# Altium footprint library PcbLib_jp.PcbLib: 178 footprints (part 6 of 12)
Each footprint in its own frame and in the unit in brackets; x right, y up, seen from the top. Pads: shape width x height; smd on the part's side, far side on the other; paste and mask are expansions set on the pad; w line width, h text height; cw(c..) or ccw(c..) is an arc to the next point about the centre after c.
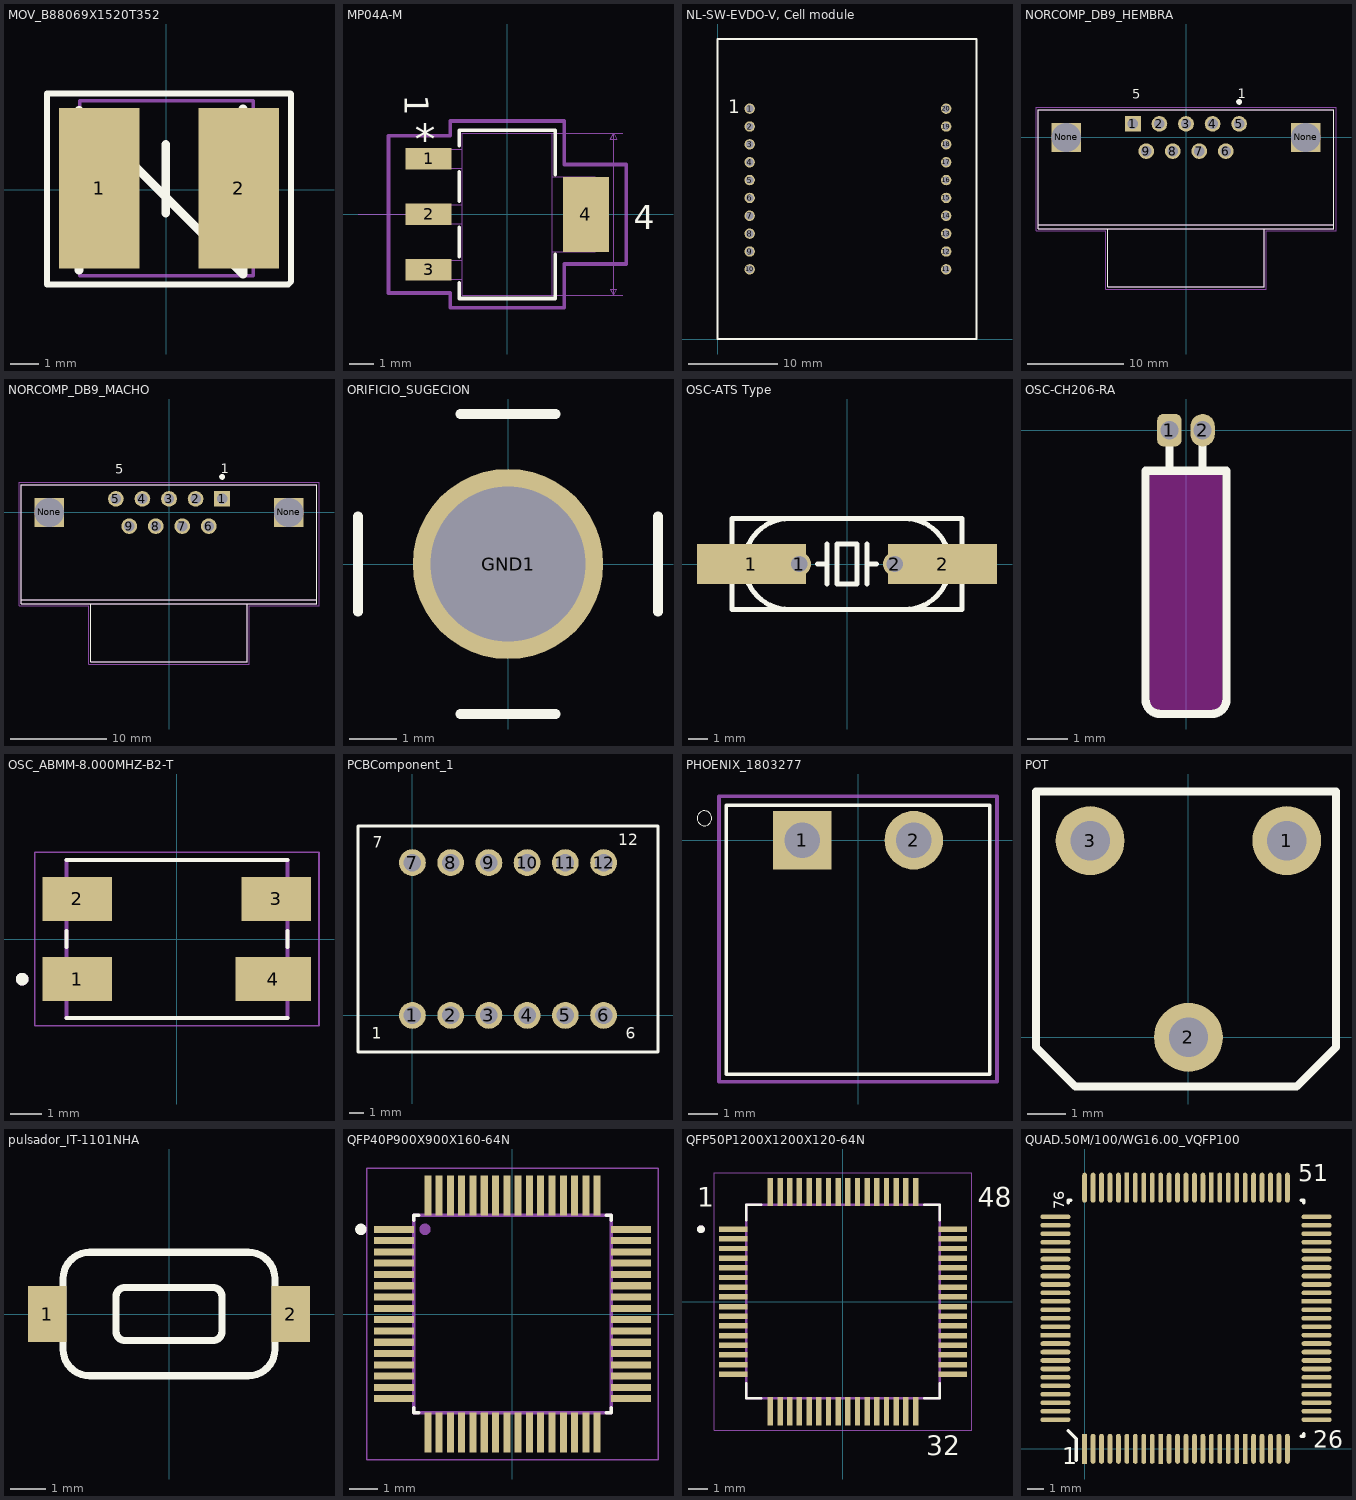
[diagram p5: the footprints below, top view; thin cyan lines are the x and y axes]

## MOV_B88069X1520T352 [mm]
height 9.3
pads (2):
  rect 2.8x5.6 smd: 1(-2.337,0.051) 2(2.515,0.051)
Top Overlay:
  lines w0.203: -4.166,-3.302 4.242,-3.302 4.343,-3.2 4.343,3.327 4.318,3.353 -4.166,3.353 ; -4.166,-3.226 -4.166,3.277
  lines w0.305: -3.048,-2.794 -3.048,2.769 2.667,-2.946 2.667,2.819 ; -0.025,-0.813 -0.025,1.575
Mechanical 13:
  lines w0.127: -3.025,-2.997 3.025,-2.997 3.025,3.099 -3.025,3.099 -3.025,-2.997
Mechanical 15:
  lines w0.05: -4.14,-3.277 4.318,-3.277 4.318,3.353 -4.14,3.353 -4.14,-3.277
3D body "CG5250.STEP": height 5.7, standoff 0.3, extent -2.322,-2.642 2.678,2.758

## MP04A-M [mil]
pads (4):
  rect 75x35 smd paste+0 mask+0: 1(-128,90.55) 2(-128,0) 3(-128,-90.55)
  rect 75x122 smd paste+0 mask+0: 4(128,0)
Top Overlay:
  lines w6: -78,-111.97 -78,-137 78,-137 78,-64.92 ; -78,-69.13 -78,-21.42 ; -78,21.42 -78,69.13 ; -78,111.97 -78,137 78,137 78,64.92
  text "4" at 206,-24 h39.37
  text "1" at -167,195 h39.37
  text "*" at -150.5,98.05 h50
Mechanical 7:
  lines w1: -243,0 -128,0 ; 0,-132 188,-132 ; 0,132 188,132 ; 173,-132 178,-122 168,-122 173,-132 ; 173,-132 173,132 ; 173,132 178,122 168,122 173,132
Mechanical 13:
  lines w1: -143.5,-106.05 -73,-106.05 -73,-75.05 -143.5,-75.05 -143.5,-106.05 ; -143.5,-15.5 -73,-15.5 -73,15.5 -143.5,15.5 -143.5,-15.5 ; -143.5,75.05 -73,75.05 -73,106.05 -143.5,106.05 -143.5,75.05 ; -73,-132 -73,132 73,132 73,-132 -73,-132 ; 73,-61 143.5,-61 143.5,61 73,61 73,-61
  text "*" at -75.5,78.05 h50
Mechanical 15:
  lines w6: -193.5,-128.05 -193.5,128.05 -93,128.05 -93,152 93,152 93,81 193.5,81 193.5,-81 93,-81 93,-152 -93,-152 -93,-128.05 -193.5,-128.05
3D body: height 10, standoff 0, extent 0,0 10,10
3D body "MP04A-M.step": height 71.1, standoff 0, extent -142.5,-132 144.51,132.01

## NL-SW-EVDO-V, Cell module [mil] "3M, 950510-6102-AR connector"
height 27.95
pads (20):
  round 46 hole 32: 1(141.73,1015.75) 3(141.73,858.27) 4(141.73,779.53) 5(141.73,700.79) 6(141.73,622.05) 7(141.73,543.31) 8(141.73,464.57) 9(141.73,385.83) 10(141.73,307.09) 11(1007.87,307.09) 12(1007.87,385.83) 13(1007.87,464.57) 14(1007.87,543.31) 15(1007.87,622.05) 16(1007.87,700.79) 17(1007.87,779.53) 18(1007.87,858.27) 20(1007.87,1015.75)
  round 45.98 hole 32.01: 2(141.73,937.01) 19(1007.87,937.01)
Top Overlay:
  lines w7: 0,0 1141.73,0 1141.73,1322.83 0,1322.83 0,0
  text "1" at 47.24,996.06 h59.06
3D body "1001764_NL-SW-LTE-QBG96_3DMODEL.step": height 452.76, standoff 26.12, extent 0,5 1140,1339.02

## NORCOMP_DB9_HEMBRA [mm]
pads (11):
  rect 1.635x1.635 hole 1.09: 1(-5.54,1.42)
  round 1.635 hole 1.09: 2(-2.77,1.42) 3(0,1.42) 4(2.77,1.42) 5(5.54,1.42) 6(4.155,-1.42) 7(1.385,-1.42) 8(-1.385,-1.42) 9(-4.155,-1.42)
  rect 3.05x3.05 hole 3.05 unplated: None(-12.495,0) None(12.495,0)
Top Overlay:
  circle w0.3: c5.54,3.714 r0.15
  lines w0.127: -15.405,-9.12 -15.405,-9.5 -8.15,-9.5 ; -15.405,-9.12 -15.405,2.92 15.405,2.92 15.405,-9.12 ; -15.405,-9.12 15.405,-9.12 ; -8.15,-9.5 8.15,-9.5 ; -8.15,-9.5 -8.15,-15.59 8.15,-15.59 8.15,-9.5 ; 8.15,-9.5 15.405,-9.5 15.405,-9.12
  text "1" at 5.385,4.089 h1
  text "5" at -5.613,4.064 h1
Mechanical 13:
  lines w0.127: -15.405,-9.5 -15.405,-9.12 ; -15.405,-9.5 -8.15,-9.5 ; -15.405,-9.5 -15.405,-9.12 ; -15.405,-9.5 -8.15,-9.5 ; -15.405,-9.12 -15.405,2.92 ; -15.405,-9.12 15.405,-9.12 ; -15.405,-9.12 -15.405,2.92 ; -15.405,-9.12 15.405,-9.12 ; -15.405,2.92 15.405,2.92 ; -15.405,2.92 15.405,2.92 ; -8.15,-15.59 -8.15,-9.5 ; -8.15,-15.59 8.15,-15.59 ; -8.15,-15.59 -8.15,-9.5 ; -8.15,-15.59 8.15,-15.59 ; -8.15,-9.5 8.15,-9.5 ; -8.15,-9.5 8.15,-9.5 ; 8.15,-15.59 8.15,-9.5 ; 8.15,-15.59 8.15,-9.5 ; 8.15,-9.5 15.405,-9.5 ; 8.15,-9.5 15.405,-9.5 ; 15.405,-9.5 15.405,-9.12 ; 15.405,-9.5 15.405,-9.12 ; 15.405,-9.12 15.405,2.92 ; 15.405,-9.12 15.405,2.92
Mechanical 16:
  lines w0.05: -15.655,-9.75 -8.4,-9.75 -8.4,-15.84 8.4,-15.84 8.4,-9.75 15.655,-9.75 15.655,3.17 -15.655,3.17 -15.655,-9.75
3D body "182-009-213.STEP": height 13.55, standoff -2.17, extent -15.354,-15.519 15.456,2.997

## NORCOMP_DB9_MACHO [mm]
pads (11):
  rect 1.635x1.635 hole 1.09 square: 1(5.54,1.42)
  round 1.635 hole 1.09: 2(2.77,1.42) 3(0,1.42) 4(-2.77,1.42) 5(-5.54,1.42) 6(4.155,-1.42) 7(1.385,-1.42) 8(-1.385,-1.42) 9(-4.155,-1.42)
  rect 3.05x3.05 hole 3.05 unplated: None(-12.495,0) None(12.495,0)
Top Overlay:
  circle w0.3: c5.54,3.714 r0.15
  lines w0.127: -15.405,-9.12 -15.405,-9.5 -8.15,-9.5 ; -15.405,-9.12 -15.405,2.92 15.405,2.92 15.405,-9.12 ; -15.405,-9.12 15.405,-9.12 ; -8.15,-9.5 8.15,-9.5 ; -8.15,-9.5 -8.15,-15.59 8.15,-15.59 8.15,-9.5 ; 8.15,-9.5 15.405,-9.5 15.405,-9.12
  text "1" at 5.385,4.089 h1
  text "5" at -5.613,4.064 h1
Mechanical 13:
  lines w0.127: -15.405,-9.5 -15.405,-9.12 ; -15.405,-9.5 -8.15,-9.5 ; -15.405,-9.5 -15.405,-9.12 ; -15.405,-9.5 -8.15,-9.5 ; -15.405,-9.12 -15.405,2.92 ; -15.405,-9.12 15.405,-9.12 ; -15.405,-9.12 -15.405,2.92 ; -15.405,-9.12 15.405,-9.12 ; -15.405,2.92 15.405,2.92 ; -15.405,2.92 15.405,2.92 ; -8.15,-15.59 -8.15,-9.5 ; -8.15,-15.59 8.15,-15.59 ; -8.15,-15.59 -8.15,-9.5 ; -8.15,-15.59 8.15,-15.59 ; -8.15,-9.5 8.15,-9.5 ; -8.15,-9.5 8.15,-9.5 ; 8.15,-15.59 8.15,-9.5 ; 8.15,-15.59 8.15,-9.5 ; 8.15,-9.5 15.405,-9.5 ; 8.15,-9.5 15.405,-9.5 ; 15.405,-9.5 15.405,-9.12 ; 15.405,-9.5 15.405,-9.12 ; 15.405,-9.12 15.405,2.92 ; 15.405,-9.12 15.405,2.92
Mechanical 16:
  lines w0.05: -15.655,-9.75 -8.4,-9.75 -8.4,-15.84 8.4,-15.84 8.4,-9.75 15.655,-9.75 15.655,3.17 -15.655,3.17 -15.655,-9.75
3D body "182-009-213.STEP": height 13.55, standoff -2.17, extent -15.354,-15.519 15.456,2.997

## ORIFICIO_SUGECION [mm] "Connector; SMB Straight"
pads (1):
  round 4 hole 3.25: GND1(0,0)
Top Overlay:
  circle w0.2: c0,0 r1.8
  lines w0.2: -3.15,-1 -3.15,1 ; -1,-3.15 1,-3.15 ; -1,3.15 1,3.15 ; 3.15,-1 3.15,1
Mechanical 1:
  circle w0.025: c0,0 r1.8
  circle w0.025: c0,0 r1.05
  circle w0.025: c0,0 r0.2

## OSC-ATS Type [mm] "ATS Type Crystal"
height 4.4
pads (4):
  rect 5.5x2 smd: 1(-4.826,0) 2(4.826,0)
  round 1.2 hole 0.813 paste+0 mask+0.102: 1(-2.413,0)
  round 1.2 hole 0.813: 2(2.413,0)
Top Overlay:
  lines w0.254: -1.5,0 -1,0 ; -1,-1 -1,1 ; 1,-1 1,1 ; 1,0 1.5,0 ; -2.9,-2.3 cw(c-2.9,0) -2.9,2.3 ; -2.9,-2.3 2.9,-2.3 ; -2.9,-2.3 -5.8,-2.3 -5.8,2.3 -2.9,2.3 ; -2.9,2.3 2.9,2.3 ; 2.9,-2.3 ccw(c2.9,0) 2.9,2.3 ; 2.9,-2.3 5.8,-2.3 5.8,2.3 2.9,2.3 ; -0.5,-1 -0.5,1 0.5,1 0.5,-1 -0.5,-1
3D body "Crystal HC49_US-SM.STEP": height 4.3, standoff 0, extent -6.4,-2.415 6.4,2.415

## OSC-CH206-RA [mm]
pads (2):
  rrect50% 0.6x0.8 hole 0.45: 1(-0.41,0)
  oval 0.6x0.8 hole 0.45: 2(0.41,0)
Top Layer:
  pour cut-out: -0.051,-1.346
Top Layer keep-out:
  rectangle: -0.9,-6.998 0.9,-1.1
Top Overlay:
  lines w0.203: -0.635,-7 cw(c-0.635,-6.635) -1,-6.635 -1,-6.604 -1,-1 1,-1 1,-6.635 cw(c0.635,-6.635) 0.635,-7 -0.604,-7 ; -0.41,-1 -0.41,0 ; 0.41,-1 0.41,0
3D body "CH-206-RA.STEP": height 2.1, standoff -0.77, extent -1,-6.998 1,0.127

## OSC_ABMM-8.000MHZ-B2-T [mm]
pads (4):
  rect 2.2x1.4 smd: 1(-3.15,-1.27) 2(-3.15,1.27) 3(3.15,1.27)
  rect 2.4x1.4 smd: 4(3.05,-1.27)
Top Overlay:
  circle w0.2: c-4.9,-1.27 r0.1
  lines w0.127: -3.5,-2.5 3.5,-2.5 ; -3.5,-0.25 -3.5,0.25 ; -3.5,2.5 3.5,2.5 ; 3.5,-0.25 3.5,0.25
Mechanical 13:
  circle w0.2: c-4.9,-1.27 r0.1
  lines w0.127: -3.5,-2.5 -3.5,2.5 3.5,2.5 3.5,-2.5 -3.5,-2.5
Mechanical 15:
  lines w0.05: -4.5,-2.75 -4.5,2.75 4.5,2.75 4.5,-2.75 -4.5,-2.75
3D body "step_temp.STEP": height 1.3, standoff 0, extent -3.6,-2.6 3.6,2.6

## PCBComponent_1 [mm]
pads (12):
  round 1.824 hole 1.2: 1(0,0) 2(2.606,0) 3(5.212,0) 4(7.818,0) 5(10.424,0) 6(13.03,0) 7(0,10.414) 8(2.606,10.414) 9(5.212,10.414) 10(7.818,10.414) 11(10.424,10.414) 12(13.03,10.414)
Top Overlay:
  lines w0.2: -3.708,-2.489 -3.708,12.903 16.739,12.903 16.739,-2.489 -3.708,-2.489
  text "12" at 14.021,11.608 h0.76
  text "7" at -2.718,11.43 h0.76
  text "6" at 14.529,-1.6 h0.76
  text "1" at -2.769,-1.6 h0.76

## PHOENIX_1803277 [mm]
pads (2):
  rect 2x2 hole 1.2: 1(-1.905,0)
  round 2 hole 1.2: 2(1.905,0)
Top Overlay:
  circle w0: c-5.25,0.75 r0.254
  lines w0.127: -4.505,-8 -4.505,1.2 4.505,1.2 4.505,-8 -4.505,-8
Mechanical 15:
  lines w0.127: -4.75,-8.25 -4.75,1.5 4.75,1.5 4.75,-8.25 -4.75,-8.25
3D body "1803277.stp": height 7.25, standoff -3.4, extent -4.505,-8.05 4.505,1.25

## POT [mil]
pads (3):
  round 70 / inner round 60 / far side round 70 hole 40 mask+10: 1(100,200) 2(0,0) 3(-100,200)
Top Overlay:
  lines w8: -155,-10 -115,-50 110,-50 150,-10 150,250 -155,250 -155,-10

## pulsador_IT-1101NHA [mm]
height 3.9
pads (2):
  rect 1.1x1.6 smd: 1(-3.45,0) 2(3.45,0)
Top Overlay:
  lines w0.203: -2.25,1.75 ccw(c-2.25,1) -3,1 -3,-1 ccw(c-2.25,-1) -2.25,-1.75 2.25,-1.75 ccw(c2.25,-1) 3,-1 3,1 ccw(c2.25,1) 2.25,1.75 ; -2.25,1.75 2.25,1.75 ; -2.25,1.75 2.25,1.75 ; -1.5,-0.5 ccw(c-1.25,-0.5) -1.25,-0.75 1.25,-0.75 ccw(c1.25,-0.5) 1.5,-0.5 1.5,0.5 ccw(c1.25,0.5) 1.25,0.75 -1.25,0.75 ccw(c-1.25,0.5) -1.5,0.5 -1.5,-0.5
3D body "User Library-TVBU19.step": height 2.5, standoff 0, extent -3.05,-1.85 3.05,1.85

## QFP40P900X900X160-64N [mm]
pads (64):
  rrect6% 1.41x0.25 smd: 1(-4.2,3) 2(-4.2,2.6) 3(-4.2,2.2) 4(-4.2,1.8) 5(-4.2,1.4) 6(-4.2,1) 7(-4.2,0.6) 8(-4.2,0.2) 9(-4.2,-0.2) 10(-4.2,-0.6) 11(-4.2,-1) 12(-4.2,-1.4) 13(-4.2,-1.8) 14(-4.2,-2.2) 15(-4.2,-2.6) 16(-4.2,-3) 33(4.2,-3) 34(4.2,-2.6) 35(4.2,-2.2) 36(4.2,-1.8) 37(4.2,-1.4) 38(4.2,-1) 39(4.2,-0.6) 40(4.2,-0.2) 41(4.2,0.2) 42(4.2,0.6) 43(4.2,1) 44(4.2,1.4) 45(4.2,1.8) 46(4.2,2.2) 47(4.2,2.6) 48(4.2,3)
  rrect6% 0.25x1.41 smd: 17(-3,-4.2) 18(-2.6,-4.2) 19(-2.2,-4.2) 20(-1.8,-4.2) 21(-1.4,-4.2) 22(-1,-4.2) 23(-0.6,-4.2) 24(-0.2,-4.2) 25(0.2,-4.2) 26(0.6,-4.2) 27(1,-4.2) 28(1.4,-4.2) 29(1.8,-4.2) 30(2.2,-4.2) 31(2.6,-4.2) 32(3,-4.2) 49(3,4.2) 50(2.6,4.2) 51(2.2,4.2) 52(1.8,4.2) 53(1.4,4.2) 54(1,4.2) 55(0.6,4.2) 56(0.2,4.2) 57(-0.2,4.2) 58(-0.6,4.2) 59(-1,4.2) 60(-1.4,4.2) 61(-1.8,4.2) 62(-2.2,4.2) 63(-2.6,4.2) 64(-3,4.2)
Top Overlay:
  circle w0.2: c-5.373,3 r0.1
  lines w0.127: -3.5,-3.328 -3.5,-3.5 -3.328,-3.5 ; -3.5,3.328 -3.5,3.5 -3.328,3.5 ; 3.328,-3.5 3.5,-3.5 3.5,-3.328 ; 3.328,3.5 3.5,3.5 3.5,3.328
Mechanical 13:
  circle w0.2: c-3.099,3 r0.1
  lines w0.127: -3.5,-3.5 -3.5,3.5 3.5,3.5 3.5,-3.5 -3.5,-3.5
Mechanical 15:
  lines w0.05: -5.155,-5.155 -5.155,5.155 5.155,5.155 5.155,-5.155 -5.155,-5.155

## QFP50P1200X1200X120-64N [mm]
pads (64):
  rect 1.47x0.28 smd: 1(-5.67,3.75) 2(-5.67,3.25) 3(-5.67,2.75) 4(-5.67,2.25) 5(-5.67,1.75) 6(-5.67,1.25) 7(-5.67,0.75) 8(-5.67,0.25) 9(-5.67,-0.25) 10(-5.67,-0.75) 11(-5.67,-1.25) 12(-5.67,-1.75) 13(-5.67,-2.25) 14(-5.67,-2.75) 15(-5.67,-3.25) 16(-5.67,-3.75) 33(5.67,-3.75) 34(5.67,-3.25) 35(5.67,-2.75) 36(5.67,-2.25) 37(5.67,-1.75) 38(5.67,-1.25) 39(5.67,-0.75) 40(5.67,-0.25) 41(5.67,0.25) 42(5.67,0.75) 43(5.67,1.25) 44(5.67,1.75) 45(5.67,2.25) 46(5.67,2.75) 47(5.67,3.25) 48(5.67,3.75)
  rect 0.28x1.47 smd: 17(-3.75,-5.67) 18(-3.25,-5.67) 19(-2.75,-5.67) 20(-2.25,-5.67) 21(-1.75,-5.67) 22(-1.25,-5.67) 23(-0.75,-5.67) 24(-0.25,-5.67) 25(0.25,-5.67) 26(0.75,-5.67) 27(1.25,-5.67) 28(1.75,-5.67) 29(2.25,-5.67) 30(2.75,-5.67) 31(3.25,-5.67) 32(3.75,-5.67) 49(3.75,5.67) 50(3.25,5.67) 51(2.75,5.67) 52(2.25,5.67) 53(1.75,5.67) 54(1.25,5.67) 55(0.75,5.67) 56(0.25,5.67) 57(-0.25,5.67) 58(-0.75,5.67) 59(-1.25,5.67) 60(-1.75,5.67) 61(-2.25,5.67) 62(-2.75,5.67) 63(-3.25,5.67) 64(-3.75,5.67)
Top Overlay:
  circle w0.2: c-7.34,3.75 r0.1
  lines w0.127: -5,-4.21 -5,-5 -4.21,-5 ; -5,4.21 -5,5 -4.21,5 ; 4.21,-5 5,-5 5,-4.21 ; 4.21,5 5,5 5,4.21
  text "48" at 6.96,4.902 h1
  text "32" at 4.293,-7.925 h1
  text "1" at -7.544,4.902 h1
Mechanical 13:
  circle w0.2: c-7.34,3.75 r0.1
  circle w0.2: c-7.34,3.75 r0.1
  lines w0.127: -5,-5 5,-5 ; -5,-5 -5,5 ; -5,-5 5,-5 ; -5,-5 -5,5 ; -5,5 5,5 ; -5,5 5,5 ; 5,-5 5,5 ; 5,-5 5,5
Mechanical 15:
  lines w0.05: -6.655,-6.655 6.655,-6.655 6.655,6.655 -6.655,6.655 -6.655,-6.655
3D body "User Library-TQFP64-2.STEP": height 0.55, standoff -0.65, extent -6.049,-6.151 6.151,6.049

## QUAD.50M/100/WG16.00_VQFP100 [mil]
height 137.8
pads (100):
  rect 11x70 smd: 1(0,0) 10(177.3,0) 20(374.3,0) 60(295.5,608.8) 70(98.5,608.8)
  oval 11x70 smd: 2(19.7,0) 3(39.4,0) 4(59.1,0) 5(78.8,0) 6(98.5,0) 7(118.2,0) 8(137.9,0) 9(157.6,0) 11(197,0) 12(216.7,0) 13(236.4,0) 14(256.1,0) 15(275.8,0) 16(295.5,0) 17(315.2,0) 18(334.9,0) 19(354.6,0) 21(394,0) 22(413.7,0) 23(433.4,0) 24(453.1,0) 25(472.8,0) 51(472.8,608.8) 52(453.1,608.8) 53(433.4,608.8) 54(413.7,608.8) 55(394,608.8) 56(374.3,608.8) 57(354.6,608.8) 58(334.9,608.8) 59(315.2,608.8) 61(275.8,608.8) 62(256.1,608.8) 63(236.4,608.8) 64(216.7,608.8) 65(197,608.8) 66(177.3,608.8) 67(157.6,608.8) 68(137.9,608.8) 69(118.2,608.8) 71(78.8,608.8) 72(59.1,608.8) 73(39.4,608.8) 74(19.7,608.8) 75(0,608.8)
  oval 70x11 smd: 26(540.8,68) 27(540.8,87.7) 28(540.8,107.4) 29(540.8,127.1) 31(540.8,166.5) 32(540.8,186.2) 33(540.8,205.9) 34(540.8,225.6) 35(540.8,245.3) 36(540.8,265) 37(540.8,284.7) 38(540.8,304.4) 39(540.8,324.1) 41(540.8,363.5) 42(540.8,383.2) 43(540.8,402.9) 44(540.8,422.6) 45(540.8,442.3) 46(540.8,462) 47(540.8,481.7) 48(540.8,501.4) 49(540.8,521.1) 50(540.8,540.8) 76(-68,540.8) 77(-68,521.1) 78(-68,501.4) 79(-68,481.7) 81(-68,442.3) 82(-68,422.6) 83(-68,402.9) 84(-68,383.2) 85(-68,363.5) 86(-68,343.8) 87(-68,324.1) 88(-68,304.4) 89(-68,284.7) 91(-68,245.3) 92(-68,225.6) 93(-68,205.9) 94(-68,186.2) 95(-68,166.5) 96(-68,146.8) 97(-68,127.1) 98(-68,107.4) 99(-68,87.7) 100(-68,68)
  rect 70x11 smd: 30(540.8,146.8) 40(540.8,343.8) 80(-68,462) 90(-68,265)
Top Overlay:
  lines w8: -38.6,41.9 -38.5,41.9 -19.8,23.2 -19.8,-26.8 ; -38.6,573.2 -38.6,579.4 -32.3,579.4 ; 505.2,29.4 511.4,29.4 511.4,35.7 ; 505.2,579.4 511.4,579.4 511.4,573.2
  text "1" at -52.17,-35.43 h40
  text "26" at 533,2 h40
  text "51" at 498,624 h40
  text "76" at -47,559 h25
3D body "User Library-LQFP100_05.STEP": height 62.99, standoff 0, extent -78.74,-11.81 551.18,618.11